# Altium footprint library Test.PcbLib: 245 footprints (part 8 of 17)
Each footprint in its own frame and in the unit in brackets; x right, y up, seen from the top. Pads: shape width x height; smd on the part's side, far side on the other; paste and mask are expansions set on the pad; w line width, h text height; cw(c..) or ccw(c..) is an arc to the next point about the centre after c.
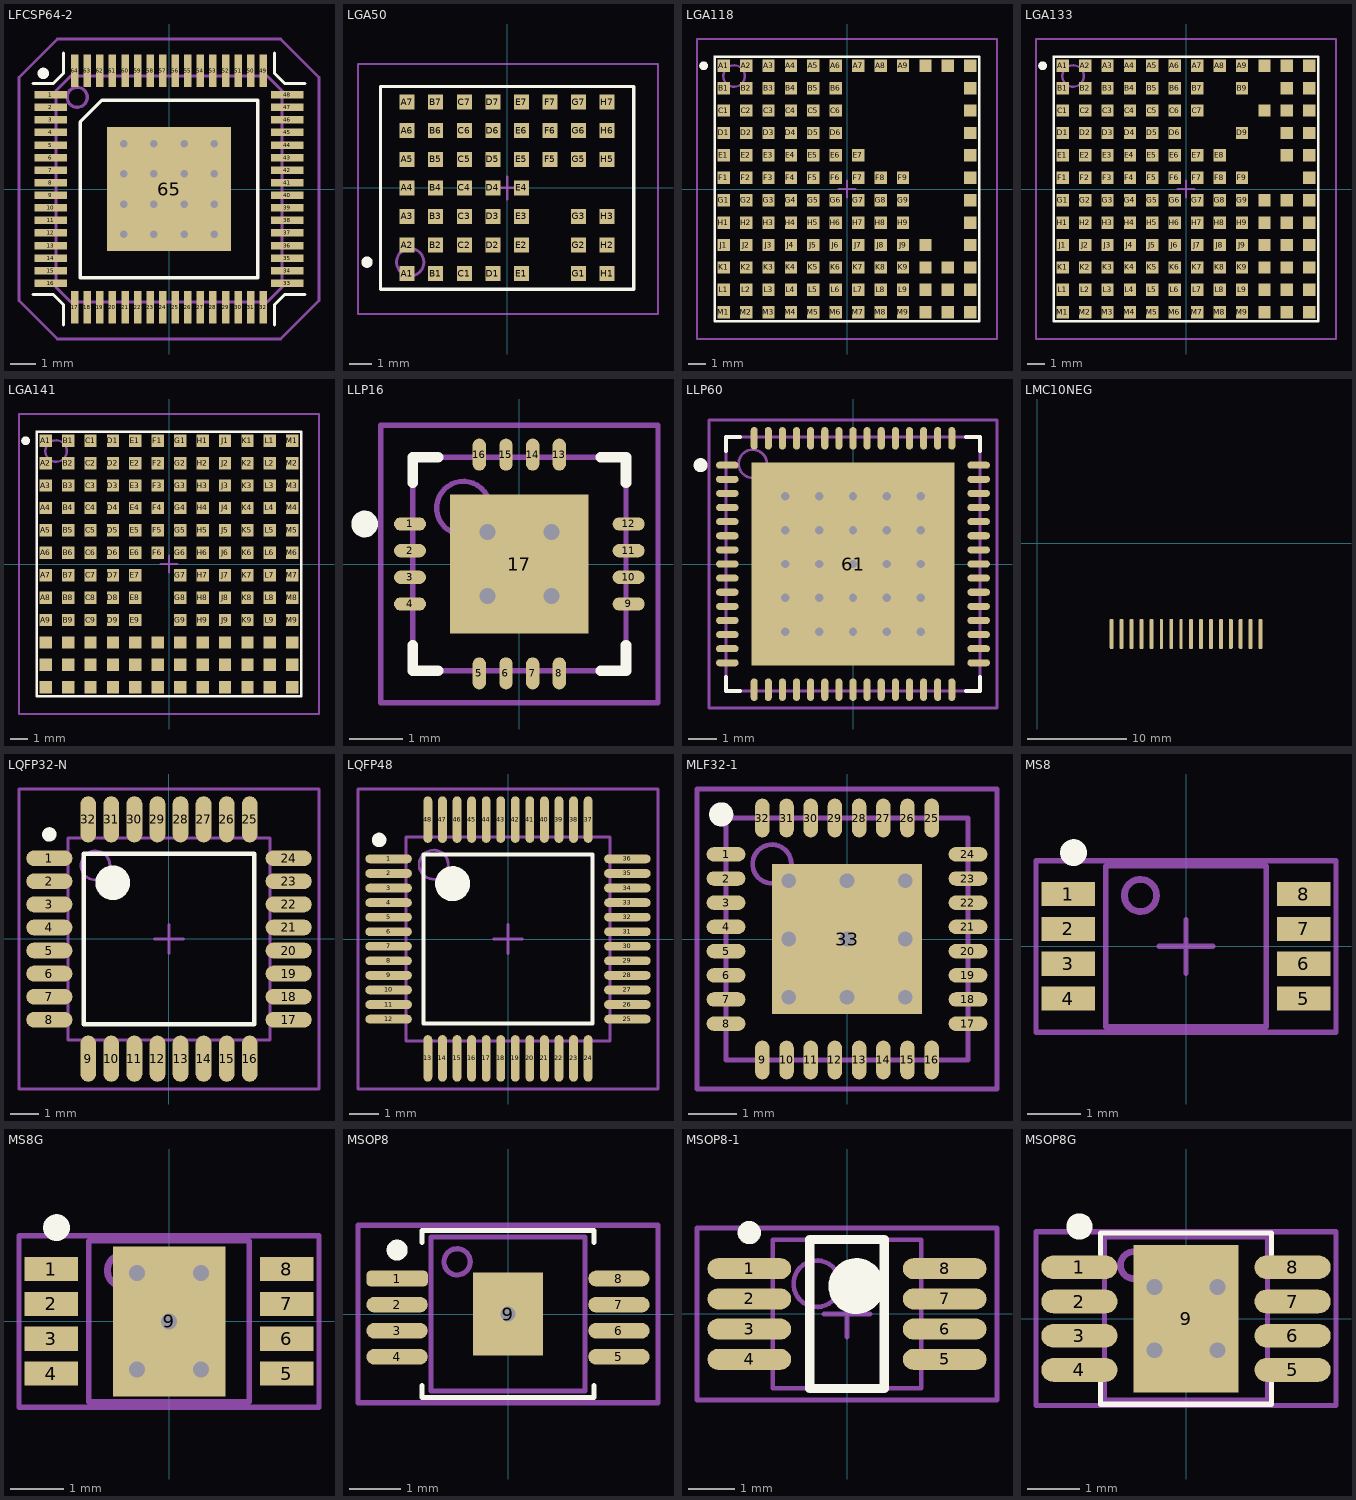
[diagram p7: the footprints below, top view; thin cyan lines are the x and y axes]

## LFCSP64-2 [mm]
pads (65):
  rect 1.3x0.3 smd mask+0.051: 1(-4.7,3.75) 2(-4.7,3.25) 3(-4.7,2.75) 4(-4.7,2.25) 5(-4.7,1.75) 6(-4.7,1.25) 7(-4.7,0.75) 8(-4.7,0.25) 9(-4.7,-0.25) 10(-4.7,-0.75) 11(-4.7,-1.25) 12(-4.7,-1.75) 13(-4.7,-2.25) 14(-4.7,-2.75) 15(-4.7,-3.25) 16(-4.7,-3.75) 33(4.7,-3.75) 34(4.7,-3.25) 35(4.7,-2.75) 36(4.7,-2.25) 37(4.7,-1.75) 38(4.7,-1.25) 39(4.7,-0.75) 40(4.7,-0.25) 41(4.7,0.25) 42(4.7,0.75) 43(4.7,1.25) 44(4.7,1.75) 45(4.7,2.25) 46(4.7,2.75) 47(4.7,3.25) 48(4.7,3.75)
  rect 0.3x1.3 smd mask+0.051: 17(-3.75,-4.7) 18(-3.25,-4.7) 19(-2.75,-4.7) 20(-2.25,-4.7) 21(-1.75,-4.7) 22(-1.25,-4.7) 23(-0.75,-4.7) 24(-0.25,-4.7) 25(0.25,-4.7) 26(0.75,-4.7) 27(1.25,-4.7) 28(1.75,-4.7) 29(2.25,-4.7) 30(2.75,-4.7) 31(3.25,-4.7) 32(3.75,-4.7) 49(3.75,4.7) 50(3.25,4.7) 51(2.75,4.7) 52(2.25,4.7) 53(1.75,4.7) 54(1.25,4.7) 55(0.75,4.7) 56(0.25,4.7) 57(-0.25,4.7) 58(-0.75,4.7) 59(-1.25,4.7) 60(-1.75,4.7) 61(-2.25,4.7) 62(-2.75,4.7) 63(-3.25,4.7) 64(-3.75,4.7)
  rect 4.928x4.928 smd paste-5 mask-5: 65(0,0)
via -0.6,-0.6 diameter 0.65 hole 0.3
via -0.6,0.6 diameter 0.65 hole 0.3
via -0.6,1.8 diameter 0.65 hole 0.3
via -0.6,-1.8 diameter 0.65 hole 0.3
via 0.6,-1.8 diameter 0.65 hole 0.3
via 0.6,1.8 diameter 0.65 hole 0.3
via 0.6,0.6 diameter 0.65 hole 0.3
via 0.6,-0.6 diameter 0.65 hole 0.3
via -1.8,-1.8 diameter 0.65 hole 0.3
via -1.8,1.8 diameter 0.65 hole 0.3
via -1.8,0.6 diameter 0.65 hole 0.3
via -1.8,-0.6 diameter 0.65 hole 0.3
via 1.8,-1.8 diameter 0.65 hole 0.3
via 1.8,1.8 diameter 0.65 hole 0.3
via 1.8,0.6 diameter 0.65 hole 0.3
via 1.8,-0.6 diameter 0.65 hole 0.3
Top Overlay:
  circle w0.254: c-5,4.6 r0.1
  lines w0.127: -5.4,-4.2 -4.6,-4.2 -4.2,-4.6 -4.2,-5.4 ; -5.4,4.2 -4.6,4.2 -4.2,4.6 -4.2,5.4 ; 4.2,-5.4 4.2,-4.6 4.6,-4.2 5.4,-4.2 ; 4.2,5.4 4.2,4.6 4.6,4.2 5.4,4.2 ; -3.528,-3.528 3.528,-3.528 3.528,3.528 -2.672,3.528 -3.528,2.672 -3.528,-3.528
Top Paste:
  drawing of 25 lines, arcs and shapes, not listed
Top Solder:
  drawing of 16 lines, arcs and shapes, not listed
Mechanical 13:
  circle w0.127: c-3.65,3.65 r0.4
  lines w0.127: -4.5,-3.9 -3.9,-4.5 3.9,-4.5 4.5,-3.9 4.5,3.9 3.9,4.5 -3.9,4.5 -4.5,3.9 -4.5,-3.9
Mechanical 15:
  lines w0.1: -0.508,0 0.508,0 ; 0,-0.508 0,0.508
  lines w0.102: -5.969,-4.445 -5.969,4.445 -4.445,5.969 4.445,5.969 5.969,4.445 5.969,-4.445 4.445,-5.969 -4.445,-5.969 -5.969,-4.445
3D body: height 1, standoff 0, extent -4.5,-4.6 4.5,4.4

## LGA50 [mm] "LGA, 50-Leads, Body 11,25x9,0mm,  Pitch 1,27mm"
height 2.92
pads (50):
  rect 0.665x0.665 smd: A1(-4.445,-3.81) A2(-4.445,-2.54) A3(-4.445,-1.27) A4(-4.445,0) A5(-4.445,1.27) A6(-4.445,2.54) A7(-4.445,3.81) B1(-3.175,-3.81) B2(-3.175,-2.54) B3(-3.175,-1.27) B4(-3.175,0) B5(-3.175,1.27) B6(-3.175,2.54) B7(-3.175,3.81) C1(-1.905,-3.81) C2(-1.905,-2.54) C3(-1.905,-1.27) C4(-1.905,0) C5(-1.905,1.27) C6(-1.905,2.54) C7(-1.905,3.81) D1(-0.635,-3.81) D2(-0.635,-2.54) D3(-0.635,-1.27) D4(-0.635,0) D5(-0.635,1.27) D6(-0.635,2.54) D7(-0.635,3.81) E1(0.635,-3.81) E2(0.635,-2.54) E3(0.635,-1.27) E4(0.635,0) E5(0.635,1.27) E6(0.635,2.54) E7(0.635,3.81) F5(1.905,1.27) F6(1.905,2.54) F7(1.905,3.81) G1(3.175,-3.81) G2(3.175,-2.54) G3(3.175,-1.27) G5(3.175,1.27) G6(3.175,2.54) G7(3.175,3.81) H1(4.445,-3.81) H2(4.445,-2.54) H3(4.445,-1.27) H5(4.445,1.27) H6(4.445,2.54) H7(4.445,3.81)
Top Overlay:
  circle w0.25: c-6.225,-3.3 r0.125
  region: -5.62,4.5 -5.625,4.495 -5.625,4.5
  lines w0.15: -5.625,4.495 -5.62,4.5 ; -5.625,-4.5 5.625,-4.5 5.625,4.5 -5.625,4.5 -5.625,-4.5
Mechanical 13:
  circle w0.127: c-4.308,-3.3 r0.608
  lines w0.1: -5.625,-4.5 -5.625,4.5 5.625,4.5 5.625,-4.5 -5.625,-4.5
Mechanical 15:
  lines w0.1: -0.5,0 0.5,0 ; 0,-0.5 0,0.5 ; -6.625,-5.6 6.7,-5.6 6.7,5.5 -6.625,5.5 -6.625,-5.6
3D body: height 2.93, standoff 2.92, extent -4.913,-3.978 -3.681,-2.755
3D body: height 2.92, standoff 0, extent -5.662,-4.5 5.588,4.5

## LGA118 [mm] "LGA, 118-Leads, Body 15,0x15,0mm,  Pitch 1,27mm"
height 2.92
pads (118):
  rect 0.7x0.7 smd: A1(-6.985,6.985) A2(-5.715,6.985) A3(-4.445,6.985) A4(-3.175,6.985) A5(-1.905,6.985) A6(-0.635,6.985) A7(0.635,6.985) A8(1.905,6.985) A9(3.175,6.985) A10(4.445,6.985) A11(5.715,6.985) A12(6.985,6.985) B1(-6.985,5.715) B2(-5.715,5.715) B3(-4.445,5.715) B4(-3.175,5.715) B5(-1.905,5.715) B6(-0.635,5.715) B12(6.985,5.715) C1(-6.985,4.445) C2(-5.715,4.445) C3(-4.445,4.445) C4(-3.175,4.445) C5(-1.905,4.445) C6(-0.635,4.445) C12(6.985,4.445) D1(-6.985,3.175) D2(-5.715,3.175) D3(-4.445,3.175) D4(-3.175,3.175) D5(-1.905,3.175) D6(-0.635,3.175) D12(6.985,3.175) E1(-6.985,1.905) E2(-5.715,1.905) E3(-4.445,1.905) E4(-3.175,1.905) E5(-1.905,1.905) E6(-0.635,1.905) E7(0.635,1.905) E12(6.985,1.905) F1(-6.985,0.635) F2(-5.715,0.635) F3(-4.445,0.635) F4(-3.175,0.635) F5(-1.905,0.635) F6(-0.635,0.635) F7(0.635,0.635) F8(1.905,0.635) F9(3.175,0.635) F12(6.985,0.635) G1(-6.985,-0.635) G2(-5.715,-0.635) G3(-4.445,-0.635) G4(-3.175,-0.635) G5(-1.905,-0.635) G6(-0.635,-0.635) G7(0.635,-0.635) G8(1.905,-0.635) G9(3.175,-0.635) G12(6.985,-0.635) H1(-6.985,-1.905) H2(-5.715,-1.905) H3(-4.445,-1.905) H4(-3.175,-1.905) H5(-1.905,-1.905) H6(-0.635,-1.905) H7(0.635,-1.905) H8(1.905,-1.905) H9(3.175,-1.905) H12(6.985,-1.905) J1(-6.985,-3.175) J2(-5.715,-3.175) J3(-4.445,-3.175) J4(-3.175,-3.175) J5(-1.905,-3.175) J6(-0.635,-3.175) J7(0.635,-3.175) J8(1.905,-3.175) J9(3.175,-3.175) J10(4.445,-3.175) J12(6.985,-3.175) K1(-6.985,-4.445) K2(-5.715,-4.445) K3(-4.445,-4.445) K4(-3.175,-4.445) K5(-1.905,-4.445) K6(-0.635,-4.445) K7(0.635,-4.445) K8(1.905,-4.445) K9(3.175,-4.445) K10(4.445,-4.445) K11(5.715,-4.445) K12(6.985,-4.445) L1(-6.985,-5.715) L2(-5.715,-5.715) L3(-4.445,-5.715) L4(-3.175,-5.715) L5(-1.905,-5.715) L6(-0.635,-5.715) L7(0.635,-5.715) L8(1.905,-5.715) L9(3.175,-5.715) L10(4.445,-5.715) L11(5.715,-5.715) L12(6.985,-5.715) M1(-6.985,-6.985) M2(-5.715,-6.985) M3(-4.445,-6.985) M4(-3.175,-6.985) M5(-1.905,-6.985) M6(-0.635,-6.985) M7(0.635,-6.985) M8(1.905,-6.985) M9(3.175,-6.985) M10(4.445,-6.985) M11(5.715,-6.985) M12(6.985,-6.985)
Top Overlay:
  circle w0.25: c-8.125,6.985 r0.125
  region: -7.495,7.5 -7.5,7.495 -7.5,7.5
  lines w0.15: -7.5,7.495 -7.495,7.5 ; -7.5,-7.5 -7.5,7.5 7.5,7.5 7.5,-7.5 -7.5,-7.5
Mechanical 13:
  circle w0.127: c-6.4,6.4 r0.608
  lines w0.1: -7.5,-7.5 -7.5,7.5 7.5,7.5 7.5,-7.5 -7.5,-7.5
Mechanical 15:
  lines w0.1: -0.5,0 0.5,0 ; 0,-0.5 0,0.5 ; -8.5,-8.5 -8.5,8.5 8.5,8.5 8.5,-8.5 -8.5,-8.5
3D body: height 2.93, standoff 2.92, extent -7.012,5.788 -5.78,7.012
3D body: height 2.92, standoff 0.05, extent -7.5,-7.5 7.5,7.5

## LGA133 [mm] "LGA 133-Leads Body 15,0x15,0mm  R1,27mm"
height 2.92
pads (133):
  rect 0.7x0.7 smd paste-0.038: A1(-6.985,6.985) A2(-5.715,6.985) A3(-4.445,6.985) A4(-3.175,6.985) A5(-1.905,6.985) A6(-0.635,6.985) A7(0.635,6.985) A8(1.905,6.985) A9(3.175,6.985) A10(4.445,6.985) A11(5.715,6.985) A12(6.985,6.985) B1(-6.985,5.715) B2(-5.715,5.715) B3(-4.445,5.715) B4(-3.175,5.715) B5(-1.905,5.715) B6(-0.635,5.715) B7(0.635,5.715) B9(3.175,5.715) B11(5.715,5.715) B12(6.985,5.715) C1(-6.985,4.445) C2(-5.715,4.445) C3(-4.445,4.445) C4(-3.175,4.445) C5(-1.905,4.445) C6(-0.635,4.445) C7(0.635,4.445) C10(4.445,4.445) C11(5.715,4.445) C12(6.985,4.445) D1(-6.985,3.175) D2(-5.715,3.175) D3(-4.445,3.175) D4(-3.175,3.175) D5(-1.905,3.175) D6(-0.635,3.175) D9(3.175,3.175) D11(5.715,3.175) D12(6.985,3.175) E1(-6.985,1.905) E2(-5.715,1.905) E3(-4.445,1.905) E4(-3.175,1.905) E5(-1.905,1.905) E6(-0.635,1.905) E7(0.635,1.905) E8(1.905,1.905) E11(5.715,1.905) E12(6.985,1.905) F1(-6.985,0.635) F2(-5.715,0.635) F3(-4.445,0.635) F4(-3.175,0.635) F5(-1.905,0.635) F6(-0.635,0.635) F7(0.635,0.635) F8(1.905,0.635) F9(3.175,0.635) F12(6.985,0.635) G1(-6.985,-0.635) G2(-5.715,-0.635) G3(-4.445,-0.635) G4(-3.175,-0.635) G5(-1.905,-0.635) G6(-0.635,-0.635) G7(0.635,-0.635) G8(1.905,-0.635) G9(3.175,-0.635) G10(4.445,-0.635) G11(5.715,-0.635) G12(6.985,-0.635) H1(-6.985,-1.905) H2(-5.715,-1.905) H3(-4.445,-1.905) H4(-3.175,-1.905) H5(-1.905,-1.905) H6(-0.635,-1.905) H7(0.635,-1.905) H8(1.905,-1.905) H9(3.175,-1.905) H10(4.445,-1.905) H11(5.715,-1.905) H12(6.985,-1.905) J1(-6.985,-3.175) J2(-5.715,-3.175) J3(-4.445,-3.175) J4(-3.175,-3.175) J5(-1.905,-3.175) J6(-0.635,-3.175) J7(0.635,-3.175) J8(1.905,-3.175) J9(3.175,-3.175) J10(4.445,-3.175) J11(5.715,-3.175) J12(6.985,-3.175) K1(-6.985,-4.445) K2(-5.715,-4.445) K3(-4.445,-4.445) K4(-3.175,-4.445) K5(-1.905,-4.445) K6(-0.635,-4.445) K7(0.635,-4.445) K8(1.905,-4.445) K9(3.175,-4.445) K10(4.445,-4.445) K11(5.715,-4.445) K12(6.985,-4.445) L1(-6.985,-5.715) L2(-5.715,-5.715) L3(-4.445,-5.715) L4(-3.175,-5.715) L5(-1.905,-5.715) L6(-0.635,-5.715) L7(0.635,-5.715) L8(1.905,-5.715) L9(3.175,-5.715) L10(4.445,-5.715) L11(5.715,-5.715) L12(6.985,-5.715) M1(-6.985,-6.985) M2(-5.715,-6.985) M3(-4.445,-6.985) M4(-3.175,-6.985) M5(-1.905,-6.985) M6(-0.635,-6.985) M7(0.635,-6.985) M8(1.905,-6.985) M9(3.175,-6.985) M10(4.445,-6.985) M11(5.715,-6.985) M12(6.985,-6.985)
Top Overlay:
  circle w0.25: c-8.125,6.985 r0.125
  region: -7.495,7.5 -7.5,7.495 -7.5,7.5
  lines w0.15: -7.5,7.495 -7.495,7.5 ; -7.5,-7.5 -7.5,7.5 7.5,7.5 7.5,-7.5 -7.5,-7.5
Mechanical 13:
  circle w0.127: c-6.4,6.4 r0.608
  lines w0.1: -7.5,-7.5 -7.5,7.5 7.5,7.5 7.5,-7.5 -7.5,-7.5
Mechanical 15:
  lines w0.1: -0.5,0 0.5,0 ; 0,-0.5 0,0.5 ; -8.5,-8.5 -8.5,8.5 8.5,8.5 8.5,-8.5 -8.5,-8.5
3D body: height 2.92, standoff 0.05, extent -7.5,-7.5 7.5,7.5
3D body: height 2.93, standoff 2.92, extent -7.012,5.788 -5.78,7.012

## LGA141 [mm] "LGA, 141-Leads, Body 15,0x15,0mm,  Pitch 1,27mm"
height 2.92
pads (141):
  rect 0.7x0.7 smd: A1(-6.985,6.985) A2(-6.985,5.715) A3(-6.985,4.445) A4(-6.985,3.175) A5(-6.985,1.905) A6(-6.985,0.635) A7(-6.985,-0.635) A8(-6.985,-1.905) A9(-6.985,-3.175) A10(-6.985,-4.445) A11(-6.985,-5.715) A12(-6.985,-6.985) B1(-5.715,6.985) B2(-5.715,5.715) B3(-5.715,4.445) B4(-5.715,3.175) B5(-5.715,1.905) B6(-5.715,0.635) B7(-5.715,-0.635) B8(-5.715,-1.905) B9(-5.715,-3.175) B10(-5.715,-4.445) B11(-5.715,-5.715) B12(-5.715,-6.985) C1(-4.445,6.985) C2(-4.445,5.715) C3(-4.445,4.445) C4(-4.445,3.175) C5(-4.445,1.905) C6(-4.445,0.635) C7(-4.445,-0.635) C8(-4.445,-1.905) C9(-4.445,-3.175) C10(-4.445,-4.445) C11(-4.445,-5.715) C12(-4.445,-6.985) D1(-3.175,6.985) D2(-3.175,5.715) D3(-3.175,4.445) D4(-3.175,3.175) D5(-3.175,1.905) D6(-3.175,0.635) D7(-3.175,-0.635) D8(-3.175,-1.905) D9(-3.175,-3.175) D10(-3.175,-4.445) D11(-3.175,-5.715) D12(-3.175,-6.985) E1(-1.905,6.985) E2(-1.905,5.715) E3(-1.905,4.445) E4(-1.905,3.175) E5(-1.905,1.905) E6(-1.905,0.635) E7(-1.905,-0.635) E8(-1.905,-1.905) E9(-1.905,-3.175) E10(-1.905,-4.445) E11(-1.905,-5.715) E12(-1.905,-6.985) F1(-0.635,6.985) F2(-0.635,5.715) F3(-0.635,4.445) F4(-0.635,3.175) F5(-0.635,1.905) F6(-0.635,0.635) F10(-0.635,-4.445) F11(-0.635,-5.715) F12(-0.635,-6.985) G1(0.635,6.985) G2(0.635,5.715) G3(0.635,4.445) G4(0.635,3.175) G5(0.635,1.905) G6(0.635,0.635) G7(0.635,-0.635) G8(0.635,-1.905) G9(0.635,-3.175) G10(0.635,-4.445) G11(0.635,-5.715) G12(0.635,-6.985) H1(1.905,6.985) H2(1.905,5.715) H3(1.905,4.445) H4(1.905,3.175) H5(1.905,1.905) H6(1.905,0.635) H7(1.905,-0.635) H8(1.905,-1.905) H9(1.905,-3.175) H10(1.905,-4.445) H11(1.905,-5.715) H12(1.905,-6.985) J1(3.175,6.985) J2(3.175,5.715) J3(3.175,4.445) J4(3.175,3.175) J5(3.175,1.905) J6(3.175,0.635) J7(3.175,-0.635) J8(3.175,-1.905) J9(3.175,-3.175) J10(3.175,-4.445) J11(3.175,-5.715) J12(3.175,-6.985) K1(4.445,6.985) K2(4.445,5.715) K3(4.445,4.445) K4(4.445,3.175) K5(4.445,1.905) K6(4.445,0.635) K7(4.445,-0.635) K8(4.445,-1.905) K9(4.445,-3.175) K10(4.445,-4.445) K11(4.445,-5.715) K12(4.445,-6.985) L1(5.715,6.985) L2(5.715,5.715) L3(5.715,4.445) L4(5.715,3.175) L5(5.715,1.905) L6(5.715,0.635) L7(5.715,-0.635) L8(5.715,-1.905) L9(5.715,-3.175) L10(5.715,-4.445) L11(5.715,-5.715) L12(5.715,-6.985) M1(6.985,6.985) M2(6.985,5.715) M3(6.985,4.445) M4(6.985,3.175) M5(6.985,1.905) M6(6.985,0.635) M7(6.985,-0.635) M8(6.985,-1.905) M9(6.985,-3.175) M10(6.985,-4.445) M11(6.985,-5.715) M12(6.985,-6.985)
Top Overlay:
  circle w0.25: c-8.125,6.985 r0.125
  region: -7.495,7.5 -7.5,7.495 -7.5,7.5
  lines w0.15: -7.5,7.495 -7.495,7.5 ; -7.5,-7.5 7.5,-7.5 7.5,7.5 -7.5,7.5 -7.5,-7.5
Mechanical 13:
  circle w0.127: c-6.4,6.4 r0.608
  lines w0.1: -7.5,-7.5 7.5,-7.5 7.5,7.5 -7.5,7.5 -7.5,-7.5
Mechanical 15:
  lines w0.1: -0.5,0 0.5,0 ; 0,-0.5 0,0.5 ; -8.5,-8.5 8.5,-8.5 8.5,8.5 -8.5,8.5 -8.5,-8.5
3D body: height 2.93, standoff 2.92, extent -7.012,5.788 -5.78,7.012
3D body: height 2.92, standoff 0.05, extent -7.5,-7.5 7.5,7.5

## LLP16 [mm] "QFN, 16-Leads, Body 4,0x4,0mm (max), Pitch 0,50mm, IPC Medium Density"
height 0.8
pads (17):
  oval 0.6x0.25 smd mask+0.051: 1(-2.05,0.75) 2(-2.05,0.25) 3(-2.05,-0.25) 4(-2.05,-0.75) 9(2.05,-0.75) 10(2.05,-0.25) 11(2.05,0.25) 12(2.05,0.75)
  oval 0.25x0.6 smd mask+0.051: 5(-0.75,-2.05) 6(-0.25,-2.05) 7(0.25,-2.05) 8(0.75,-2.05) 13(0.75,2.05) 14(0.25,2.05) 15(-0.25,2.05) 16(-0.75,2.05)
  rect 2.6x2.6 smd paste-2 mask-2: 17(0,0)
via -0.6,0.6 diameter 0.65 hole 0.3
via 0.6,0.6 diameter 0.65 hole 0.3
via -0.6,-0.6 diameter 0.65 hole 0.3
via 0.6,-0.6 diameter 0.65 hole 0.3
Top Overlay:
  circle w0.25: c-2.9,0.75 r0.125
  lines w0.2: -2,-1.525 -2,-2 -1.525,-2 ; -2,1.525 -2,2 -1.525,2 ; 1.525,-2 2,-2 2,-1.525 ; 1.525,2 2,2 2,1.525
Top Paste:
  region: -1.3,0.45 -0.925,0.45 -0.75,0.275 -0.75,-0.275 -0.925,-0.45 -1.3,-0.45
  region: -0.45,0.275 -0.275,0.45 0.275,0.45 0.45,0.275 0.45,-0.275 0.275,-0.45 -0.275,-0.45 -0.45,-0.275
  region: -1.3,1.3 -0.75,1.3 -0.75,0.925 -0.925,0.75 -1.3,0.75
  region: -0.45,-1.3 -0.45,-0.925 -0.275,-0.75 0.275,-0.75 0.45,-0.925 0.45,-1.3
  region: 1.3,-0.45 0.925,-0.45 0.75,-0.275 0.75,0.275 0.925,0.45 1.3,0.45
  region: 0.45,1.3 0.45,0.925 0.275,0.75 -0.275,0.75 -0.45,0.925 -0.45,1.3
  region: -1.3,-1.3 -1.3,-0.75 -0.925,-0.75 -0.75,-0.925 -0.75,-1.3
  region: 1.3,-1.3 0.75,-1.3 0.75,-0.925 0.925,-0.75 1.3,-0.75
  region: 1.3,1.3 1.3,0.75 0.925,0.75 0.75,0.925 0.75,1.3
Top Solder:
  region: 1.35,1.35 1.35,0.6 0.931,0.6 0.906,0.727 0.834,0.834 0.727,0.906 0.6,0.931 0.473,0.906 0.366,0.834 0.294,0.727 0.269,0.6 0.275,0.6 0.269,0.6 0.294,0.473 0.366,0.366 0.473,0.294 0.6,0.269 0.6,0.275 0.6,0.269 0.727,0.294 0.834,0.366 0.906,0.473 0.931,0.6 0.925,0.6 1.35,0.6 1.35,0 0,0 0,1.35
  region: 1.35,-1.35 0.6,-1.35 0.6,-0.931 0.727,-0.906 0.834,-0.834 0.906,-0.727 0.931,-0.6 0.906,-0.473 0.834,-0.366 0.727,-0.294 0.6,-0.269 0.6,-0.275 0.6,-0.269 0.473,-0.294 0.366,-0.366 0.294,-0.473 0.269,-0.6 0.275,-0.6 0.269,-0.6 0.294,-0.727 0.366,-0.834 0.473,-0.906 0.6,-0.931 0.6,-0.925 0.6,-1.35 0,-1.35 0,0 1.35,0
  region: -1.35,-1.35 -1.35,-0.6 -0.931,-0.6 -0.906,-0.727 -0.834,-0.834 -0.727,-0.906 -0.6,-0.931 -0.473,-0.906 -0.366,-0.834 -0.294,-0.727 -0.269,-0.6 -0.275,-0.6 -0.269,-0.6 -0.294,-0.473 -0.366,-0.366 -0.473,-0.294 -0.6,-0.269 -0.6,-0.275 -0.6,-0.269 -0.727,-0.294 -0.834,-0.366 -0.906,-0.473 -0.931,-0.6 -0.925,-0.6 -1.35,-0.6 -1.35,0 0,0 0,-1.35
  region: -1.35,1.35 -0.6,1.35 -0.6,0.931 -0.727,0.906 -0.834,0.834 -0.906,0.727 -0.931,0.6 -0.906,0.473 -0.834,0.366 -0.727,0.294 -0.6,0.269 -0.6,0.275 -0.6,0.269 -0.473,0.294 -0.366,0.366 -0.294,0.473 -0.269,0.6 -0.275,0.6 -0.269,0.6 -0.294,0.727 -0.366,0.834 -0.473,0.906 -0.6,0.931 -0.6,0.925 -0.6,1.35 0,1.35 0,0 -1.35,0
Mechanical 13:
  circle w0.1: c-1.05,1.05 r0.5
  lines w0.1: -2,-2 -2,2 2,2 2,-2 -2,-2
Mechanical 15:
  lines w0.1: -0.5,0 0.5,0 ; 0,-0.5 0,0.5 ; -2.6,-2.6 -2.6,2.6 2.6,2.6 2.6,-2.6 -2.6,-2.6
3D body: height 0.8, standoff 0.01, extent -2,-2 2,2

## LLP60 [mm] "Leadless 60 pin 9x9x0.8mm R0.5mm"
height 0.8
pads (61):
  oval 0.8x0.25 smd mask+0.025: 1(-4.45,3.5) 2(-4.45,3) 3(-4.45,2.5) 4(-4.45,2) 5(-4.45,1.5) 6(-4.45,1) 7(-4.45,0.5) 8(-4.45,0) 9(-4.45,-0.5) 10(-4.45,-1) 11(-4.45,-1.5) 12(-4.45,-2) 13(-4.45,-2.5) 14(-4.45,-3) 15(-4.45,-3.5) 31(4.45,-3.5) 32(4.45,-3) 33(4.45,-2.5) 34(4.45,-2) 35(4.45,-1.5) 36(4.45,-1) 37(4.45,-0.5) 38(4.45,0) 39(4.45,0.5) 40(4.45,1) 41(4.45,1.5) 42(4.45,2) 43(4.45,2.5) 44(4.45,3) 45(4.45,3.5)
  oval 0.25x0.8 smd mask+0.025: 16(-3.5,-4.45) 17(-3,-4.45) 18(-2.5,-4.45) 19(-2,-4.45) 20(-1.5,-4.45) 21(-1,-4.45) 22(-0.5,-4.45) 23(0,-4.45) 24(0.5,-4.45) 25(1,-4.45) 26(1.5,-4.45) 27(2,-4.45) 28(2.5,-4.45) 29(3,-4.45) 30(3.5,-4.45) 46(3.5,4.45) 47(3,4.45) 48(2.5,4.45) 49(2,4.45) 50(1.5,4.45) 51(1,4.45) 52(0.5,4.45) 53(0,4.45) 54(-0.5,4.45) 55(-1,4.45) 56(-1.5,4.45) 57(-2,4.45) 58(-2.5,4.45) 59(-3,4.45) 60(-3.5,4.45)
  rect 7.2x7.2 smd paste-50 mask-50: 61(0,0)
via 2.4,-2.4 diameter 0.65 hole 0.3
via 1.2,-2.4 diameter 0.65 hole 0.3
via 0,-2.4 diameter 0.65 hole 0.3
via -1.2,-2.4 diameter 0.65 hole 0.3
via -2.4,-2.4 diameter 0.65 hole 0.3
via 2.4,-1.2 diameter 0.65 hole 0.3
via 1.2,-1.2 diameter 0.65 hole 0.3
via 0,-1.2 diameter 0.65 hole 0.3
via -1.2,-1.2 diameter 0.65 hole 0.3
via -2.4,-1.2 diameter 0.65 hole 0.3
via 2.4,0 diameter 0.65 hole 0.3
via 1.2,0 diameter 0.65 hole 0.3
via 0,0 diameter 0.65 hole 0.3
via -1.2,0 diameter 0.65 hole 0.3
via -2.4,0 diameter 0.65 hole 0.3
via 2.4,1.2 diameter 0.65 hole 0.3
via 1.2,1.2 diameter 0.65 hole 0.3
via 0,1.2 diameter 0.65 hole 0.3
via -1.2,1.2 diameter 0.65 hole 0.3
via -2.4,1.2 diameter 0.65 hole 0.3
via 2.4,2.4 diameter 0.65 hole 0.3
via 1.2,2.4 diameter 0.65 hole 0.3
via 0,2.4 diameter 0.65 hole 0.3
via -1.2,2.4 diameter 0.65 hole 0.3
via -2.4,2.4 diameter 0.65 hole 0.3
Top Overlay:
  circle w0.25: c-5.4,3.5 r0.125
  lines w0.15: -4.5,-4 -4.5,-4.5 -4,-4.5 ; -4.5,4 -4.5,4.5 -4,4.5 ; 4,-4.5 4.5,-4.5 4.5,-4 ; 4,4.5 4.5,4.5 4.5,4
Top Paste:
  drawing of 36 lines, arcs and shapes, not listed
Top Solder:
  drawing of 2 lines, arcs and shapes, not listed
Mechanical 12:
  circle w0.4: c-2.4,2.4 r0.15
  circle w0.4: c-1.2,2.4 r0.15
  circle w0.4: c0,2.4 r0.15
  circle w0.4: c1.2,2.4 r0.15
  circle w0.4: c2.4,2.4 r0.15
  circle w0.4: c-2.4,1.2 r0.15
  circle w0.4: c-1.2,1.2 r0.15
  circle w0.4: c0,1.2 r0.15
  circle w0.4: c1.2,1.2 r0.15
  circle w0.4: c2.4,1.2 r0.15
  circle w0.4: c-2.4,0 r0.15
  circle w0.4: c-1.2,0 r0.15
  circle w0.4: c0,0 r0.15
  circle w0.4: c1.2,0 r0.15
  circle w0.4: c2.4,0 r0.15
  circle w0.4: c-2.4,-1.2 r0.15
  circle w0.4: c-1.2,-1.2 r0.15
  circle w0.4: c0,-1.2 r0.15
  circle w0.4: c1.2,-1.2 r0.15
  circle w0.4: c2.4,-1.2 r0.15
  circle w0.4: c-2.4,-2.4 r0.15
  circle w0.4: c-1.2,-2.4 r0.15
  circle w0.4: c0,-2.4 r0.15
  circle w0.4: c1.2,-2.4 r0.15
  circle w0.4: c2.4,-2.4 r0.15
Mechanical 13:
  circle w0.1: c-3.55,3.55 r0.5
  lines w0.1: -4.5,-4.5 4.5,-4.5 4.5,4.5 -4.5,4.5 -4.5,-4.5
Mechanical 15:
  lines w0.1: -0.5,0 0.5,0 ; 0,-0.5 0,0.5 ; -5.1,-5.1 5.1,-5.1 5.1,5.1 -5.1,5.1 -5.1,-5.1
3D body: height 0.8, standoff 0.01, extent -4.5,-4.5 4.5,4.5
3D body: height 0.81, standoff 0.8, extent -4.06,3.04 -3.04,4.06

## LMC10NEG [mm] "10Gb/s PIN Preamp Receiver PT10GC"
height 4
pads (16):
  rrect50% 0.4x3 smd mask-0.051: 1(7.5,-9.15) 2(8.5,-9.15) 3(9.5,-9.15) 4(10.5,-9.15) 5(11.5,-9.15) 7(13.5,-9.15) 9(15.5,-9.15) 10(16.5,-9.15) 11(17.5,-9.15) 12(18.5,-9.15) 13(19.5,-9.15) 14(20.5,-9.15) 15(21.5,-9.15) 16(22.5,-9.15)
  rrect50% 0.3x3 smd mask-0.051: 6(12.5,-9.15) 8(14.5,-9.15)
Top Solder:
  region: 30.1,-6.45 30.1,6.45 -0.125,6.45 -0.125,-6.45
3D body: height -4, standoff -5, extent 0,-6.35 30,6.35
3D body: height 3.1, standoff -5, extent 4.6,-6.35 25,6.35
3D body: height 2.5, standoff -2.3, extent -9.4,-2.391 4.6,2.391
3D body: height 0, standoff -1.2, extent 6,-7.65 24,-6.35
3D body: height 0.2, standoff 0, extent 7.3,-10.125 7.7,-6.625
3D body: height 0.2, standoff 0, extent 8.3,-10.125 8.7,-6.625
3D body: height 0.2, standoff 0, extent 9.3,-10.125 9.7,-6.625
3D body: height 0.2, standoff 0, extent 10.3,-10.125 10.7,-6.625
3D body: height 0.2, standoff 0, extent 11.3,-10.125 11.7,-6.625
3D body: height 0.2, standoff 0, extent 13.3,-10.125 13.7,-6.625
3D body: height 0.2, standoff 0, extent 15.3,-10.125 15.7,-6.625
3D body: height 0.2, standoff 0, extent 16.3,-10.125 16.7,-6.625
3D body: height 0.2, standoff 0, extent 17.3,-10.125 17.7,-6.625
3D body: height 0.2, standoff 0, extent 18.3,-10.125 18.7,-6.625
3D body: height 0.2, standoff 0, extent 19.3,-10.125 19.7,-6.625
3D body: height 0.2, standoff 0, extent 20.3,-10.125 20.7,-6.625
3D body: height 0.2, standoff 0, extent 21.3,-10.125 21.7,-6.625
3D body: height 0.2, standoff 0, extent 22.3,-10.125 22.7,-6.625
3D body: height 1.6, standoff -1.4, extent -31.4,-1.494 -9.4,1.494
3D body: height 0.8, standoff -0.6, extent -71.4,-0.697 -31.4,0.697
3D body: height 0.2, standoff 0, extent 12.35,-10.125 12.65,-6.625
3D body: height 0.2, standoff 0, extent 14.35,-10.125 14.65,-6.625
3D body: height 0.2, standoff 0.1, extent -59,0.1 -45,53.1

## LQFP32-N [mm]
height 1.5
pads (32):
  oval 1.6x0.55 smd mask+0.051: 1(-4.15,2.8) 2(-4.15,2) 3(-4.15,1.2) 4(-4.15,0.4) 5(-4.15,-0.4) 6(-4.15,-1.2) 7(-4.15,-2) 8(-4.15,-2.8) 17(4.15,-2.8) 18(4.15,-2) 19(4.15,-1.2) 20(4.15,-0.4) 21(4.15,0.4) 22(4.15,1.2) 23(4.15,2) 24(4.15,2.8)
  oval 0.55x1.6 smd mask+0.051: 9(-2.8,-4.15) 10(-2,-4.15) 11(-1.2,-4.15) 12(-0.4,-4.15) 13(0.4,-4.15) 14(1.2,-4.15) 15(2,-4.15) 16(2.8,-4.15) 25(2.8,4.15) 26(2,4.15) 27(1.2,4.15) 28(0.4,4.15) 29(-0.4,4.15) 30(-1.2,4.15) 31(-2,4.15) 32(-2.8,4.15)
Top Overlay:
  circle w0.6: c-1.95,1.95 r0.3
  circle w0.25: c-4.15,3.625 r0.125
  lines w0.15: -2.95,-2.95 2.95,-2.95 2.95,2.95 -2.95,2.95 -2.95,-2.95
Mechanical 13:
  circle w0.1: c-2.55,2.55 r0.5
  lines w0.1: -3.5,-3.5 3.5,-3.5 3.5,3.5 -3.5,3.5 -3.5,-3.5
Mechanical 15:
  lines w0.1: -0.5,0 0.5,0 ; 0,-0.5 0,0.5 ; -5.2,-5.2 5.2,-5.2 5.2,5.2 -5.2,5.2 -5.2,-5.2
3D body: height 1.5, standoff 0.1, extent -3.5,-3.5 3.5,3.5
3D body: height 1.51, standoff 1.5, extent -3.05,2.05 -2.054,3.048

## LQFP48 [mm] "LQFP, 48-Leads, Body 9,0x9,0mm (max), Pitch 0,50mm, IPC Medium Density"
height 12.6
pads (48):
  oval 1.6x0.3 smd mask+0.051: 1(-4.1,2.75) 2(-4.1,2.25) 3(-4.1,1.75) 4(-4.1,1.25) 5(-4.1,0.75) 6(-4.1,0.25) 7(-4.1,-0.25) 8(-4.1,-0.75) 9(-4.1,-1.25) 10(-4.1,-1.75) 11(-4.1,-2.25) 12(-4.1,-2.75) 25(4.1,-2.75) 26(4.1,-2.25) 27(4.1,-1.75) 28(4.1,-1.25) 29(4.1,-0.75) 30(4.1,-0.25) 31(4.1,0.25) 32(4.1,0.75) 33(4.1,1.25) 34(4.1,1.75) 35(4.1,2.25) 36(4.1,2.75)
  oval 0.3x1.6 smd mask+0.051: 13(-2.75,-4.1) 14(-2.25,-4.1) 15(-1.75,-4.1) 16(-1.25,-4.1) 17(-0.75,-4.1) 18(-0.25,-4.1) 19(0.25,-4.1) 20(0.75,-4.1) 21(1.25,-4.1) 22(1.75,-4.1) 23(2.25,-4.1) 24(2.75,-4.1) 37(2.75,4.1) 38(2.25,4.1) 39(1.75,4.1) 40(1.25,4.1) 41(0.75,4.1) 42(0.25,4.1) 43(-0.25,4.1) 44(-0.75,4.1) 45(-1.25,4.1) 46(-1.75,4.1) 47(-2.25,4.1) 48(-2.75,4.1)
Top Overlay:
  circle w0.25: c-4.425,3.4 r0.125
  circle w0.6: c-1.9,1.9 r0.3
  lines w0.15: -2.9,-2.9 -2.9,2.9 2.9,2.9 2.9,-2.9 -2.9,-2.9
Mechanical 13:
  circle w0.1: c-2.55,2.55 r0.5
  lines w0.1: -3.5,-3.5 -3.5,3.5 3.5,3.5 3.5,-3.5 -3.5,-3.5
Mechanical 15:
  lines w0.1: -0.5,0 0.5,0 ; 0,-0.5 0,0.5 ; -5.15,-5.15 -5.15,5.15 5.15,5.15 5.15,-5.15 -5.15,-5.15
3D body: height 1.6, standoff 0.05, extent -3.5,-3.5 3.5,3.5
3D body: height 1.61, standoff 1.6, extent -3.06,2.04 -2.04,3.06

## MLF32-1 [mm] "MLF 32pin W5.0x5.0mm H0.85mm R0.5mm  PP 3.1x3.1mm"
height 0.85
pads (33):
  oval 0.8x0.3 smd mask+0.051: 1(-2.5,1.75) 2(-2.5,1.25) 3(-2.5,0.75) 4(-2.5,0.25) 5(-2.5,-0.25) 6(-2.5,-0.75) 7(-2.5,-1.25) 8(-2.5,-1.75) 17(2.5,-1.75) 18(2.5,-1.25) 19(2.5,-0.75) 20(2.5,-0.25) 21(2.5,0.25) 22(2.5,0.75) 23(2.5,1.25) 24(2.5,1.75)
  oval 0.3x0.8 smd mask+0.051: 9(-1.75,-2.5) 10(-1.25,-2.5) 11(-0.75,-2.5) 12(-0.25,-2.5) 13(0.25,-2.5) 14(0.75,-2.5) 15(1.25,-2.5) 16(1.75,-2.5) 25(1.75,2.5) 26(1.25,2.5) 27(0.75,2.5) 28(0.25,2.5) 29(-0.25,2.5) 30(-0.75,2.5) 31(-1.25,2.5) 32(-1.75,2.5)
  rect 3.1x3.1 smd paste-5 mask-5: 33(0,0)
via 1.2,-1.2 diameter 0.65 hole 0.3
via 0,-1.2 diameter 0.65 hole 0.3
via -1.2,-1.2 diameter 0.65 hole 0.3
via 1.2,0 diameter 0.65 hole 0.3
via 0,0 diameter 0.65 hole 0.3
via -1.2,0 diameter 0.65 hole 0.3
via 1.2,1.2 diameter 0.65 hole 0.3
via 0,1.2 diameter 0.65 hole 0.3
via -1.2,1.2 diameter 0.65 hole 0.3
Top Overlay:
  circle w0.25: c-2.6,2.575 r0.125
Top Paste:
  region: -1.05,-0.325 -0.875,-0.15 -0.325,-0.15 -0.15,-0.325 -0.15,-0.875 -0.325,-1.05 -0.875,-1.05 -1.05,-0.875
  region: 0.15,-0.325 0.325,-0.15 0.875,-0.15 1.05,-0.325 1.05,-0.875 0.875,-1.05 0.325,-1.05 0.15,-0.875
  region: 0.15,0.875 0.325,1.05 0.875,1.05 1.05,0.875 1.05,0.325 0.875,0.15 0.325,0.15 0.15,0.325
  region: -0.15,1.55 -0.15,1.525 -0.325,1.35 -0.875,1.35 -1.05,1.525 -1.05,1.55
  region: 1.05,1.55 1.05,1.525 0.875,1.35 0.325,1.35 0.15,1.525 0.15,1.55
  region: 1.55,0.15 1.525,0.15 1.35,0.325 1.35,0.875 1.525,1.05 1.55,1.05
  region: 1.55,-1.05 1.525,-1.05 1.35,-0.875 1.35,-0.325 1.525,-0.15 1.55,-0.15
  region: 0.15,-1.55 0.15,-1.525 0.325,-1.35 0.875,-1.35 1.05,-1.525 1.05,-1.55
  region: -1.05,-1.55 -1.05,-1.525 -0.875,-1.35 -0.325,-1.35 -0.15,-1.525 -0.15,-1.55
  region: -1.55,-0.15 -1.525,-0.15 -1.35,-0.325 -1.35,-0.875 -1.525,-1.05 -1.55,-1.05
  region: -1.05,0.875 -0.875,1.05 -0.325,1.05 -0.15,0.875 -0.15,0.325 -0.325,0.15 -0.875,0.15 -1.05,0.325
  region: -1.55,1.05 -1.525,1.05 -1.35,0.875 -1.35,0.325 -1.525,0.15 -1.55,0.15
Top Solder:
  drawing of 9 lines, arcs and shapes, not listed
Mechanical 13:
  circle w0.1: c-1.55,1.55 r0.4
  lines w0.1: -2.5,-2.5 2.5,-2.5 2.5,2.5 -2.5,2.5 -2.5,-2.5
Mechanical 15:
  lines w0.1: -0.5,0 0.5,0 ; 0,-0.5 0,0.5 ; -3.1,-3.1 3.1,-3.1 3.1,3.1 -3.1,3.1 -3.1,-3.1
3D body: height 0.86, standoff 0.85, extent -1.958,1.142 -1.142,1.958
3D body: height 0.85, standoff 0.01, extent -2.5,-2.5 2.5,2.5

## MS8 [mm] "MSOP 8pin 3,0x3,0mm R0,65mm High Density NO EP"
height 1.092
pads (8):
  rect 1x0.45 smd mask+0.051: 1(-2.2,0.975) 2(-2.2,0.325) 3(-2.2,-0.325) 4(-2.2,-0.975) 5(2.2,-0.975) 6(2.2,-0.325) 7(2.2,0.325) 8(2.2,0.975)
Top Overlay:
  circle w0.25: c-2.1,1.75 r0.125
Mechanical 13:
  circle w0.127: c-0.85,0.95 r0.3
  lines w0.1: -1.5,-1.5 -1.5,1.5 1.5,1.5 1.5,-1.5 -1.5,-1.5
Mechanical 15:
  lines w0.1: -0.5,0 0.5,0 ; 0,-0.5 0,0.5 ; -2.8,-1.6 -2.8,1.6 2.8,1.6 2.8,-1.6 -2.8,-1.6
3D body: height 1.09, standoff 0.1, extent -1.5,-1.5 1.5,1.5
3D body: height 1.12, standoff 1.09, extent -1.156,0.644 -0.544,1.256

## MS8G [mm] "MSOP 8pin 3,0x3,0mm R0,65mm High Density EP"
height 1.092
pads (9):
  rect 1x0.45 smd mask+0.04: 1(-2.2,0.975) 2(-2.2,0.325) 3(-2.2,-0.325) 4(-2.2,-0.975) 5(2.2,-0.975) 6(2.2,-0.325) 7(2.2,0.325) 8(2.2,0.975)
  rect 2.1x2.8 smd paste-5 mask-5: 9(0,0)
via 0,0 diameter 0.65 hole 0.3
via -0.6,-0.9 diameter 0.65 hole 0.3
via 0.6,-0.9 diameter 0.65 hole 0.3
via 0.6,0.9 diameter 0.65 hole 0.3
via -0.6,0.9 diameter 0.65 hole 0.3
Top Overlay:
  circle w0.25: c-2.1,1.75 r0.125
Top Paste:
  region: -1.05,0.575 -0.45,0.575 -0.325,0.45 -0.325,-0.45 -0.45,-0.575 -1.05,-0.575
  region: 1.05,0.575 0.45,0.575 0.325,0.45 0.325,-0.45 0.45,-0.575 1.05,-0.575
  region: -0.45,1.4 -0.45,1.225 -0.3,1.075 -0.3,0.75 -0.15,0.6 -0.15,0.325 0.15,0.325 0.15,0.6 0.3,0.725 0.3,1.075 0.45,1.225 0.45,1.4
  region: -0.45,-1.4 -0.45,-1.225 -0.3,-1.075 -0.3,-0.75 -0.15,-0.6 -0.15,-0.325 0.15,-0.325 0.15,-0.6 0.3,-0.725 0.3,-1.075 0.45,-1.225 0.45,-1.4
  region: -1.05,-1.05 -0.925,-1.05 -0.75,-1.225 -0.75,-1.4 -1.05,-1.4
  region: 1.05,-1.05 0.925,-1.05 0.75,-1.225 0.75,-1.4 1.05,-1.4
  region: 1.05,1.05 0.925,1.05 0.75,1.225 0.75,1.4 1.05,1.4
  region: -1.05,1.05 -0.925,1.05 -0.75,1.225 -0.75,1.4 -1.05,1.4
Top Solder:
  region: -1.075,1.425 -0.6,1.425 -0.6,1.225 -0.6,1.231 -0.727,1.206 -0.834,1.134 -0.906,1.027 -0.931,0.9 -0.906,0.773 -0.834,0.666 -0.727,0.594 -0.6,0.569 -0.473,0.594 -0.366,0.666 -0.294,0.773 -0.269,0.9 -0.275,0.9 -0.269,0.9 -0.294,1.027 -0.366,1.134 -0.473,1.206 -0.6,1.231 -0.6,1.225 -0.6,1.425 0,1.425 0,0.331 -0.127,0.306 -0.234,0.234 -0.306,0.127 -0.331,0 -0.325,0 -1.075,0
  region: 1.075,1.425 0.6,1.425 0.6,1.225 0.6,1.231 0.727,1.206 0.834,1.134 0.906,1.027 0.931,0.9 0.906,0.773 0.834,0.666 0.727,0.594 0.6,0.569 0.473,0.594 0.366,0.666 0.294,0.773 0.269,0.9 0.275,0.9 0.269,0.9 0.294,1.027 0.366,1.134 0.473,1.206 0.6,1.231 0.6,1.225 0.6,1.425 0,1.425 0,0.331 0.127,0.306 0.234,0.234 0.306,0.127 0.331,0 0.325,0 1.075,0
  region: 1.075,-1.425 0.6,-1.425 0.6,-1.225 0.6,-1.231 0.727,-1.206 0.834,-1.134 0.906,-1.027 0.931,-0.9 0.906,-0.773 0.834,-0.666 0.727,-0.594 0.6,-0.569 0.473,-0.594 0.366,-0.666 0.294,-0.773 0.269,-0.9 0.275,-0.9 0.269,-0.9 0.294,-1.027 0.366,-1.134 0.473,-1.206 0.6,-1.231 0.6,-1.225 0.6,-1.425 0,-1.425 0,-0.331 0.127,-0.306 0.234,-0.234 0.306,-0.127 0.331,0 0.325,0 1.075,0
  region: -1.075,-1.425 -0.6,-1.425 -0.6,-1.225 -0.6,-1.231 -0.727,-1.206 -0.834,-1.134 -0.906,-1.027 -0.931,-0.9 -0.906,-0.773 -0.834,-0.666 -0.727,-0.594 -0.6,-0.569 -0.473,-0.594 -0.366,-0.666 -0.294,-0.773 -0.269,-0.9 -0.275,-0.9 -0.269,-0.9 -0.294,-1.027 -0.366,-1.134 -0.473,-1.206 -0.6,-1.231 -0.6,-1.225 -0.6,-1.425 0,-1.425 0,-0.331 -0.127,-0.306 -0.234,-0.234 -0.306,-0.127 -0.331,0 -0.325,0 -1.075,0
Mechanical 13:
  circle w0.127: c-0.85,0.95 r0.3
  lines w0.1: -1.5,-1.5 1.5,-1.5 1.5,1.5 -1.5,1.5 -1.5,-1.5
Mechanical 15:
  lines w0.1: -0.5,0 0.5,0 ; 0,-0.5 0,0.5 ; -2.8,-1.6 2.8,-1.6 2.8,1.6 -2.8,1.6 -2.8,-1.6
3D body: height 1.12, standoff 1.09, extent -1.156,0.644 -0.544,1.256
3D body: height 1.09, standoff 0.1, extent -1.5,-1.5 1.5,1.5

## MSOP8 [mil] "MSOP 8pin with power pad R0.5mm"
height 42.99
pads (9):
  rrect50% 47x12 smd mask+2: 1(-85,27.2)
  oval 47x12 smd mask+2: 2(-85,7.2) 3(-85,-12.8) 4(-85,-32.8)
  oval 47.01x12.01 smd mask+2: 5(85,-32.8) 6(85,-12.8) 7(85,7.2) 8(85,27.2)
  rect 54.02x64.02 smd paste-196.85 mask-196.85: 9(0,0)
via 0,0 diameter 25.59 hole 11.81
Top Overlay:
  circle w8: c-85,49 r4
  lines w4.02: -66,-55 -66,-64 66,-64 66,-55 ; -66,55 -66,64 66,64 66,55
Top Paste:
  region: -26.57,-5.91 -12.8,-5.91 -5.91,-12.8 5.91,-12.8 12.8,-5.91 26.57,-5.91 26.57,-31.5 -26.57,-31.5
  region: -26.57,5.91 -12.8,5.91 -5.91,12.8 5.91,12.8 12.8,5.91 26.57,5.91 26.57,31.5 -26.57,31.5
Top Solder:
  region: -28.54,33.46 0,33.46 0,13.05 -4.99,12.05 -9.22,9.22 -12.05,4.99 -13.05,0 -12.05,-4.99 -9.22,-9.22 -4.99,-12.05 0,-13.05 4.99,-12.05 9.22,-9.22 12.05,-4.99 13.05,0 12.05,4.99 9.22,9.22 4.99,12.05 0,13.05 0,12.8 0,33.46 28.54,33.46 28.54,-33.46 -28.54,-33.46
Mechanical 13:
  circle w3.94: c-39,40 r10.05
  lines w4.02: -59,-59 59,-59 59,59 -59,59 -59,-59
Mechanical 15:
  lines w4.02: -20.32,0 19.68,0 ; 0,-20 0,20 ; -115,-68 -115,68 115,68 115,-68 -115,-68
3D body: height 43, standoff 0, extent -59,-59 59,59

## MSOP8-1 [mm] "TSOP, 8-Leads, Body 3,2x3,2mm (max), Pitch 0,65mm, IPC Medium Density"
height 1.1
pads (8):
  oval 1.8x0.45 smd mask+0.051: 1(-2.1,0.975) 2(-2.1,0.325) 3(-2.1,-0.325) 4(-2.1,-0.975) 5(2.1,-0.975) 6(2.1,-0.325) 7(2.1,0.325) 8(2.1,0.975)
Top Overlay:
  circle w0.6: c0.2,0.6 r0.3
  circle w0.25: c-2.1,1.75 r0.125
  lines w0.2: -0.8,-1.6 0.8,-1.6 0.8,1.6 -0.8,1.6 -0.8,-1.6
Mechanical 13:
  circle w0.1: c-0.65,0.65 r0.5
  lines w0.1: -1.6,-1.6 1.6,-1.6 1.6,1.6 -1.6,1.6 -1.6,-1.6
Mechanical 15:
  lines w0.1: -0.5,0 0.5,0 ; 0,-0.5 0,0.5 ; -3.225,-1.85 3.225,-1.85 3.225,1.85 -3.225,1.85 -3.225,-1.85
3D body: height 1.11, standoff 1.1, extent -1.35,0.775 -0.952,1.174
3D body: height 1.1, standoff 0.15, extent -1.6,-1.6 1.6,1.6

## MSOP8G [mm] "TSOP, 8-Leads, Body 3,1x3,1mm (max), Pitch 0,65mm, IPC High Density"
height 1.1
pads (9):
  oval 1.45x0.45 smd mask+0.051: 1(-2.025,0.975) 2(-2.025,0.325) 3(-2.025,-0.325) 4(-2.025,-0.975) 5(2.025,-0.975) 6(2.025,-0.325) 7(2.025,0.325) 8(2.025,0.975)
  rect 2x2.8 smd paste-5 mask-5: 9(0,0)
via 0.6,-0.6 diameter 0.65 hole 0.3
via -0.6,-0.6 diameter 0.65 hole 0.3
via 0.6,0.6 diameter 0.65 hole 0.3
via -0.6,0.6 diameter 0.65 hole 0.3
Top Overlay:
  circle w0.25: c-2.025,1.75 r0.125
  lines w0.102: -1.625,-1.225 -1.625,-1.626 1.625,-1.626 1.625,-1.225 ; -1.625,1.225 -1.625,1.626 1.625,1.626 1.625,1.225
Top Paste:
  region: -0.45,0.275 -0.275,0.45 0.275,0.45 0.45,0.275 0.45,-0.275 0.275,-0.45 -0.275,-0.45 -0.45,-0.275
  region: -1,0.45 -0.925,0.45 -0.75,0.275 -0.75,-0.275 -0.925,-0.45 -1,-0.45
  region: -1,1.4 -0.75,1.4 -0.75,0.925 -0.925,0.75 -1,0.75
  region: -0.45,1.4 -0.45,0.925 -0.275,0.75 0.275,0.75 0.45,0.925 0.45,1.4
  region: -1,-1.4 -0.75,-1.4 -0.75,-0.925 -0.925,-0.75 -1,-0.75
  region: 1,-1.4 0.75,-1.4 0.75,-0.925 0.925,-0.75 1,-0.75
  region: 1,1.4 0.75,1.4 0.75,0.925 0.925,0.75 1,0.75
  region: 1,0.45 0.925,0.45 0.75,0.275 0.75,-0.275 0.925,-0.45 1,-0.45
  region: -0.45,-1.4 -0.45,-0.925 -0.275,-0.75 0.275,-0.75 0.45,-0.925 0.45,-1.4
Top Solder:
  region: -1.025,1.425 -0.6,1.425 -0.6,0.931 -0.727,0.906 -0.834,0.834 -0.906,0.727 -0.931,0.6 -0.906,0.473 -0.834,0.366 -0.727,0.294 -0.6,0.269 -0.6,0.275 -0.6,0.269 -0.473,0.294 -0.366,0.366 -0.294,0.473 -0.269,0.6 -0.275,0.6 -0.269,0.6 -0.294,0.727 -0.366,0.834 -0.473,0.906 -0.6,0.931 -0.6,0.925 -0.6,1.425 0,1.425 0.002,0 -0.006,-0.019 -0.025,-0.027 -0.025,-0.025 -1.025,-0.025
  region: -1.025,-1.425 -0.6,-1.425 -0.6,-0.931 -0.727,-0.906 -0.834,-0.834 -0.906,-0.727 -0.931,-0.6 -0.906,-0.473 -0.834,-0.366 -0.727,-0.294 -0.6,-0.269 -0.6,-0.275 -0.6,-0.269 -0.473,-0.294 -0.366,-0.366 -0.294,-0.473 -0.269,-0.6 -0.275,-0.6 -0.269,-0.6 -0.294,-0.727 -0.366,-0.834 -0.473,-0.906 -0.6,-0.931 -0.6,-0.925 -0.6,-1.425 0,-1.425 0.002,0 -0.006,0.019 -0.025,0.027 -0.025,0.025 -1.025,0.025
  region: 1.025,-1.425 0.6,-1.425 0.6,-0.931 0.727,-0.906 0.834,-0.834 0.906,-0.727 0.931,-0.6 0.906,-0.473 0.834,-0.366 0.727,-0.294 0.6,-0.269 0.6,-0.275 0.6,-0.269 0.473,-0.294 0.366,-0.366 0.294,-0.473 0.269,-0.6 0.275,-0.6 0.269,-0.6 0.294,-0.727 0.366,-0.834 0.473,-0.906 0.6,-0.931 0.6,-0.925 0.6,-1.425 0,-1.425 -0.002,0 0.006,0.019 0.025,0.027 0.025,0.025 1.025,0.025
  region: 1.025,1.425 0.6,1.425 0.6,0.931 0.727,0.906 0.834,0.834 0.906,0.727 0.931,0.6 0.906,0.473 0.834,0.366 0.727,0.294 0.6,0.269 0.6,0.275 0.6,0.269 0.473,0.294 0.366,0.366 0.294,0.473 0.269,0.6 0.275,0.6 0.269,0.6 0.294,0.727 0.366,0.834 0.473,0.906 0.6,0.931 0.6,0.925 0.6,1.425 0,1.425 -0.002,0 0.006,-0.019 0.025,-0.027 0.025,-0.025 1.025,-0.025
Mechanical 13:
  circle w0.127: c-0.991,1.016 r0.255
  lines w0.1: -1.55,-1.55 1.55,-1.55 1.55,1.55 -1.55,1.55 -1.55,-1.55
Mechanical 15:
  lines w0.1: -0.5,0 0.5,0 ; 0,-0.5 0,0.5 ; -2.85,-1.65 2.85,-1.65 2.85,1.65 -2.85,1.65 -2.85,-1.65
3D body: height 1.1, standoff 0, extent -1.55,-1.55 1.55,1.55
3D body: height 1.12, standoff 1.1, extent -1.25,0.757 -0.73,1.275